# Altium footprint library SMT.PcbLib: 379 footprints (part 11 of 24)
Each footprint in its own frame and in the unit in brackets; x right, y up, seen from the top. Pads: shape width x height; smd on the part's side, far side on the other; paste and mask are expansions set on the pad; w line width, h text height; cw(c..) or ccw(c..) is an arc to the next point about the centre after c.
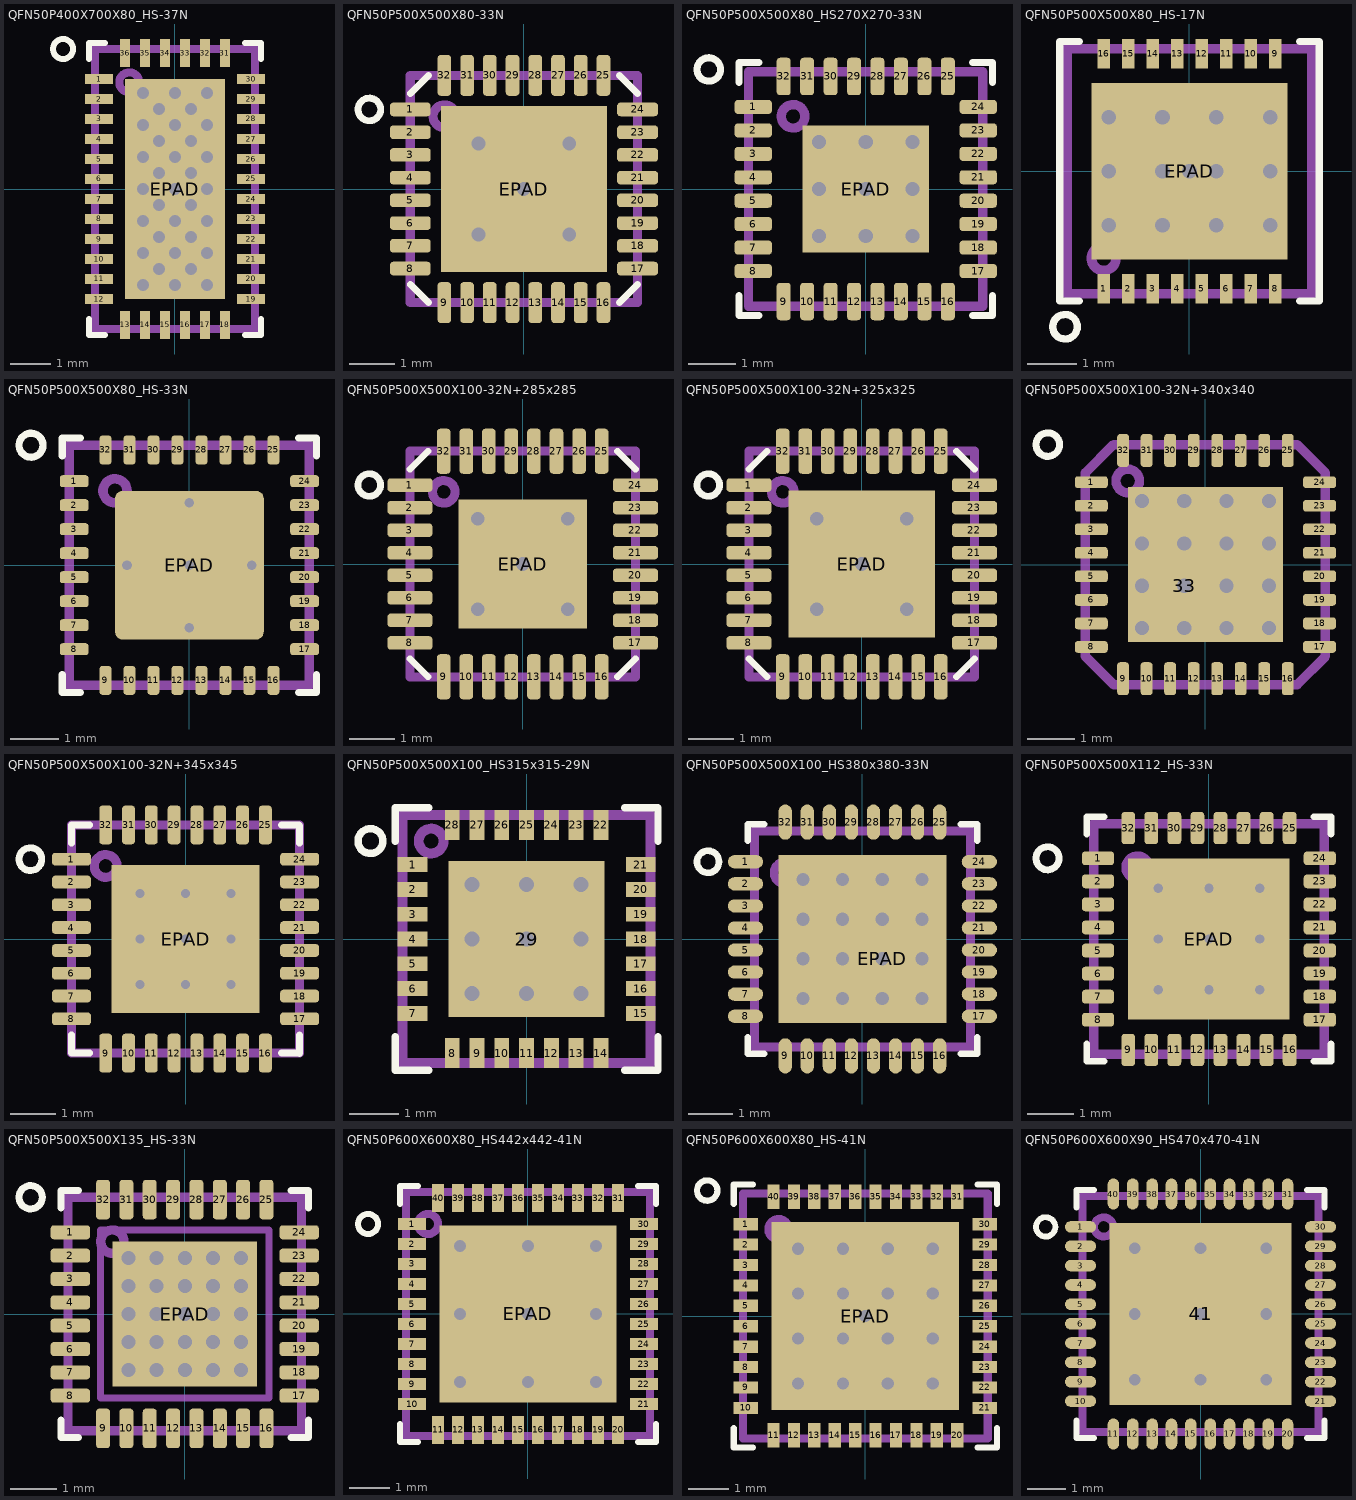
[diagram p10: the footprints below, top view; thin cyan lines are the x and y axes]

## QFN50P400X700X80_HS-37N [mm] "QFN, 36-Leads, Body 4,00x7,00mm, Pitch 0,50mm, Thermal Pad 2,50x5,50mm, IPC Medium Density"
height 0.8
pads (37):
  rect 0.7x0.25 smd paste+0 mask+0.05: 1(-1.9,2.75) 2(-1.9,2.25) 3(-1.9,1.75) 4(-1.9,1.25) 5(-1.9,0.75) 6(-1.9,0.25) 7(-1.9,-0.25) 8(-1.9,-0.75) 9(-1.9,-1.25) 10(-1.9,-1.75) 11(-1.9,-2.25) 12(-1.9,-2.75) 19(1.9,-2.75) 20(1.9,-2.25) 21(1.9,-1.75) 22(1.9,-1.25) 23(1.9,-0.75) 24(1.9,-0.25) 25(1.9,0.25) 26(1.9,0.75) 27(1.9,1.25) 28(1.9,1.75) 29(1.9,2.25) 30(1.9,2.75)
  rect 0.25x0.7 smd paste+0 mask+0.05: 13(-1.25,-3.4) 14(-0.75,-3.4) 15(-0.25,-3.4) 16(0.25,-3.4) 17(0.75,-3.4) 18(1.25,-3.4) 31(1.25,3.4) 32(0.75,3.4) 33(0.25,3.4) 34(-0.25,3.4) 35(-0.75,3.4) 36(-1.25,3.4)
  rect 2.5x5.5 hole 0.3 mask+0.05: EPAD(0,0)
via -0.4,0.4 diameter 0.6 hole 0.3
via 0.4,0.4 diameter 0.6 hole 0.3
via 0.8,0.8 diameter 0.6 hole 0.3
via 0,0.8 diameter 0.6 hole 0.3
via -0.8,0.8 diameter 0.6 hole 0.3
via -0.8,1.6 diameter 0.6 hole 0.3
via 0,1.6 diameter 0.6 hole 0.3
via 0.8,1.6 diameter 0.6 hole 0.3
via 0.4,1.2 diameter 0.6 hole 0.3
via -0.4,1.2 diameter 0.6 hole 0.3
via 0,2.4 diameter 0.6 hole 0.3
via 0.8,2.4 diameter 0.6 hole 0.3
via 0.4,2 diameter 0.6 hole 0.3
via -0.4,2 diameter 0.6 hole 0.3
via 0.8,0 diameter 0.6 hole 0.3
via -0.8,0 diameter 0.6 hole 0.3
via -0.8,2.4 diameter 0.6 hole 0.3
via -0.8,-2.4 diameter 0.6 hole 0.3
via -0.4,-2 diameter 0.6 hole 0.3
via 0.4,-2 diameter 0.6 hole 0.3
via 0.8,-2.4 diameter 0.6 hole 0.3
via 0,-2.4 diameter 0.6 hole 0.3
via -0.4,-1.2 diameter 0.6 hole 0.3
via 0.4,-1.2 diameter 0.6 hole 0.3
via 0.8,-1.6 diameter 0.6 hole 0.3
via 0,-1.6 diameter 0.6 hole 0.3
via -0.8,-1.6 diameter 0.6 hole 0.3
via -0.8,-0.8 diameter 0.6 hole 0.3
via 0,-0.8 diameter 0.6 hole 0.3
via 0.8,-0.8 diameter 0.6 hole 0.3
via 0.4,-0.4 diameter 0.6 hole 0.3
via -0.4,-0.4 diameter 0.6 hole 0.3
Top Overlay:
  circle w0.15: c-2.8,3.5 r0.25
  lines w0.15: -2.15,-3.25 -2.15,-3.65 -1.75,-3.65 ; -2.15,3.25 -2.15,3.65 -1.75,3.65 ; 1.75,-3.65 2.15,-3.65 2.15,-3.25 ; 1.75,3.65 2.15,3.65 2.15,3.25
Top Paste:
  rectangle: -1.1,-2.4 -0.1,-0.2
  region: 1.1,-0.2 0.1,-0.2 0.1,-2.4 1.1,-2.4
  region: 1.1,2.4 0.1,2.4 0.1,0.2 1.1,0.2
  rectangle: -1.1,0.2 -0.1,2.4
Mechanical 1:
  circle w0.2: c-1.143,2.667 r0.25
  lines w0.2: -2,-3.5 -2,3.5 2,3.5 2,-3.5 -2,-3.5
3D body "QFN50P400X700X80_HS-37N.step": height 0.8, standoff 0, extent -2.001,-3.501 2.001,3.501

## QFN50P500X500X80-33N [mm] "QFN, 32-Leads, Body 5,00x5,00mm, Pitch 0,50mm, Thermal Pad 3,75x3,75mm, IPC Medium Density"
height 0.8
pads (33):
  rrect50% 0.9x0.3 smd mask+0.03: 1(-2.5,1.75) 2(-2.5,1.25) 3(-2.5,0.75) 4(-2.5,0.25) 5(-2.5,-0.25) 6(-2.5,-0.75) 7(-2.5,-1.25) 8(-2.5,-1.75) 17(2.5,-1.75) 18(2.5,-1.25) 19(2.5,-0.75) 20(2.5,-0.25) 21(2.5,0.25) 22(2.5,0.75) 23(2.5,1.25) 24(2.5,1.75)
  rrect50% 0.3x0.9 smd mask+0.03: 9(-1.75,-2.5) 10(-1.25,-2.5) 11(-0.75,-2.5) 12(-0.25,-2.5) 13(0.25,-2.5) 14(0.75,-2.5) 15(1.25,-2.5) 16(1.75,-2.5) 25(1.75,2.5) 26(1.25,2.5) 27(0.75,2.5) 28(0.25,2.5) 29(-0.25,2.5) 30(-0.75,2.5) 31(-1.25,2.5) 32(-1.75,2.5)
  rect 3.65x3.65 hole 0.3 mask+0.05: EPAD(0,0)
via -1,1 diameter 0.8 hole 0.3
via 1,1 diameter 0.8 hole 0.3
via -1,-1 diameter 0.8 hole 0.3
via 1,-1 diameter 0.8 hole 0.3
Top Overlay:
  circle w0.15: c-3.4,1.75 r0.25
  lines w0.15: -2.5,-2.1 -2.1,-2.5 ; -2.5,2.1 -2.1,2.5 ; 2.1,-2.5 2.5,-2.1 ; 2.1,2.5 2.5,2.1
Top Paste:
  region: 0.3,1.6 0.3,0.3 1.7,0.3 1.7,1.6
  region: 0.3,-0.4 0.3,-1.7 1.7,-1.7 1.7,-0.4
  region: -1.7,-0.4 -1.7,-1.7 -0.3,-1.7 -0.3,-0.4
  region: -1.7,1.6 -1.7,0.3 -0.3,0.3 -0.3,1.6
Mechanical 1:
  circle w0.2: c-1.75,1.6 r0.25
  lines w0.2: -2.5,-2.5 2.5,-2.5 2.5,2.5 -2.5,2.5 -2.5,-2.5
Mechanical 15:
  lines w0.2: -0.5,0 0.5,0 ; 0,-0.5 0,0.5
3D body "User Library-qfn32-5x5.STEP": height 0.8, standoff 0, extent -2.52,-2.51 2.5,2.51

## QFN50P500X500X80_HS270X270-33N [mm] "QFN, 32-Leads, Body 5,00x5,00mm, Pitch 0,50mm, Thermal Pad 2,70x2,70mm, IPC Medium Density"
height 0.8
pads (33):
  rrect50% 0.8x0.3 smd mask+0.05: 1(-2.4,1.75) 2(-2.4,1.25) 3(-2.4,0.75) 4(-2.4,0.25) 5(-2.4,-0.25) 6(-2.4,-0.75) 7(-2.4,-1.25) 8(-2.4,-1.75) 17(2.4,-1.75) 18(2.4,-1.25) 19(2.4,-0.75) 20(2.4,-0.25) 21(2.4,0.25) 22(2.4,0.75) 23(2.4,1.25) 24(2.4,1.75)
  rrect50% 0.3x0.8 smd mask+0.05: 9(-1.75,-2.4) 10(-1.25,-2.4) 11(-0.75,-2.4) 12(-0.25,-2.4) 13(0.25,-2.4) 14(0.75,-2.4) 15(1.25,-2.4) 16(1.75,-2.4) 25(1.75,2.4) 26(1.25,2.4) 27(0.75,2.4) 28(0.25,2.4) 29(-0.25,2.4) 30(-0.75,2.4) 31(-1.25,2.4) 32(-1.75,2.4)
  rect 2.7x2.7 hole 0.3 mask+0.05: EPAD(0,0)
via 0,1 diameter 0.6 hole 0.3
via 0,-1 diameter 0.6 hole 0.3
via 1,-1 diameter 0.6 hole 0.3
via 1,0 diameter 0.6 hole 0.3
via 1,1 diameter 0.6 hole 0.3
via -1,1 diameter 0.6 hole 0.3
via -1,0 diameter 0.6 hole 0.3
via -1,-1 diameter 0.6 hole 0.3
Top Overlay:
  circle w0.15: c-3.35,2.55 r0.25
  lines w0.15: -2.7,-2.275 -2.7,-2.7 -2.275,-2.7 ; -2.7,2.275 -2.7,2.7 -2.275,2.7 ; 2.275,-2.7 2.7,-2.7 2.7,-2.275 ; 2.275,2.7 2.7,2.7 2.7,2.275
Top Paste:
  rectangle: -1.2,-1.2 1.2,1.2
Mechanical 1:
  circle w0.2: c-1.55,1.55 r0.25
  lines w0.2: -2.5,-2.5 -2.5,2.5 2.5,2.5 2.5,-2.5 -2.5,-2.5
3D body "QFN50P500X500X80_HS-33N.step": height 0.8, standoff 0, extent -2.52,-2.52 2.52,2.52

## QFN50P500X500X80_HS-17N [mm] "QFN, 16-Leads, Body 5,00x5,00mm, Pitch 0,50mm, Thermal Pad 4,00x3,60mm, IPC Medium Density"
height 0.8
pads (17):
  rect 0.25x0.6 smd paste+0 mask+0.05: 1(-1.75,-2.4) 2(-1.25,-2.4) 3(-0.75,-2.4) 4(-0.25,-2.4) 5(0.25,-2.4) 6(0.75,-2.4) 7(1.25,-2.4) 8(1.75,-2.4) 9(1.75,2.4) 10(1.25,2.4) 11(0.75,2.4) 12(0.25,2.4) 13(-0.25,2.4) 14(-0.75,2.4) 15(-1.25,2.4) 16(-1.75,2.4)
  rect 4x3.6 hole 0.3 paste-10 mask+0.1: EPAD(0,0)
via 1.65,-1.1 diameter 0.7 hole 0.3
via 0.55,-1.1 diameter 0.7 hole 0.3
via -0.55,-1.1 diameter 0.7 hole 0.3
via -1.65,-1.1 diameter 0.7 hole 0.3
via 1.65,0 diameter 0.7 hole 0.3
via 0.55,0 diameter 0.7 hole 0.3
via -0.55,0 diameter 0.7 hole 0.3
via -1.65,0 diameter 0.7 hole 0.3
via 1.65,1.1 diameter 0.7 hole 0.3
via 0.55,1.1 diameter 0.7 hole 0.3
via -0.55,1.1 diameter 0.7 hole 0.3
via -1.65,1.1 diameter 0.7 hole 0.3
Top Overlay:
  circle w0.15: c-2.54,-3.175 r0.25
  lines w0.15: -2.25,-2.65 -2.65,-2.65 -2.65,2.65 -2.25,2.65 ; 2.25,-2.65 2.65,-2.65 2.65,2.65 2.25,2.65
Top Paste:
  rectangle: 0.2,0.2 1.597,1.597
  region: -0.2,1.597 -1.597,1.597 -1.597,0.2 -0.2,0.2
  region: -0.2,-0.2 -1.597,-0.2 -1.597,-1.597 -0.2,-1.597
  rectangle: 0.2,-1.597 1.597,-0.2
Mechanical 1:
  circle w0.2: c-1.75,-1.778 r0.25
  lines w0.2: -2.5,-2.5 2.5,-2.5 2.5,2.5 -2.5,2.5 -2.5,-2.5
3D body "NHQ0016A.stp": height 0.8, standoff -0.01, extent -2.5,-2.5 2.5,2.5

## QFN50P500X500X80_HS-33N [mm] "QFN, 32-Leads, Body 5,00x5,00mm, Pitch 0,50mm, Thermal Pad 3,1x3,1mm, IPC Medium Density"
height 0.8
pads (33):
  rrect50% 0.6x0.25 smd paste+0 mask+0.05: 1(-2.4,1.75) 2(-2.4,1.25) 3(-2.4,0.75) 4(-2.4,0.25) 5(-2.4,-0.25) 6(-2.4,-0.75) 7(-2.4,-1.25) 8(-2.4,-1.75) 17(2.4,-1.75) 18(2.4,-1.25) 19(2.4,-0.75) 20(2.4,-0.25) 21(2.4,0.25) 22(2.4,0.75) 23(2.4,1.25) 24(2.4,1.75)
  rrect50% 0.25x0.6 smd paste+0 mask+0.05: 9(-1.75,-2.4) 10(-1.25,-2.4) 11(-0.75,-2.4) 12(-0.25,-2.4) 13(0.25,-2.4) 14(0.75,-2.4) 15(1.25,-2.4) 16(1.75,-2.4) 25(1.75,2.4) 26(1.25,2.4) 27(0.75,2.4) 28(0.25,2.4) 29(-0.25,2.4) 30(-0.75,2.4) 31(-1.25,2.4) 32(-1.75,2.4)
  rrect10% 3.1x3.1 hole 0.2: EPAD(0,0)
via 0,1.3 diameter 0.5 hole 0.2
via 0,-1.3 diameter 0.5 hole 0.2
via 1.3,0 diameter 0.5 hole 0.2
via -1.3,0 diameter 0.5 hole 0.2
Top Overlay:
  circle w0.15: c-3.3,2.5 r0.25
  lines w0.15: -2.65,-2.275 -2.65,-2.65 -2.275,-2.65 ; -2.65,2.275 -2.65,2.65 -2.275,2.65 ; 2.275,-2.65 2.65,-2.65 2.65,-2.275 ; 2.275,2.65 2.65,2.65 2.65,2.275
Top Paste:
  region: 1.45,1.45 0.1,1.45 0.1,0.1 1.45,0.1
  region: -1.45,1.45 -1.45,0.1 -0.1,0.1 -0.1,1.45
  rectangle: -1.45,-1.45 -0.1,-0.1
  region: 1.45,-1.45 1.45,-0.1 0.1,-0.1 0.1,-1.45
Mechanical 1:
  circle w0.2: c-1.55,1.55 r0.25
  lines w0.2: -2.5,-2.5 -2.5,2.5 2.5,2.5 2.5,-2.5 -2.5,-2.5
3D body "QFN32-5X5.stp": height 0.79, standoff -0.01, extent -2.5,-2.5 2.5,2.5

## QFN50P500X500X100-32N+285x285 [mm] "QFN, 32-Leads, Body 5,0x5,0mm (max), Pitch 0,50mm, IPC Medium Density with thermal tab 2.85x2.85"
height 1
pads (33):
  rrect50% 1x0.3 smd mask+0.03: 1(-2.5,1.75) 2(-2.5,1.25) 3(-2.5,0.75) 4(-2.5,0.25) 5(-2.5,-0.25) 6(-2.5,-0.75) 7(-2.5,-1.25) 8(-2.5,-1.75) 17(2.5,-1.75) 18(2.5,-1.25) 19(2.5,-0.75) 20(2.5,-0.25) 21(2.5,0.25) 22(2.5,0.75) 23(2.5,1.25) 24(2.5,1.75)
  rrect50% 0.3x1 smd mask+0.03: 9(-1.75,-2.5) 10(-1.25,-2.5) 11(-0.75,-2.5) 12(-0.25,-2.5) 13(0.25,-2.5) 14(0.75,-2.5) 15(1.25,-2.5) 16(1.75,-2.5) 25(1.75,2.5) 26(1.25,2.5) 27(0.75,2.5) 28(0.25,2.5) 29(-0.25,2.5) 30(-0.75,2.5) 31(-1.25,2.5) 32(-1.75,2.5)
  rect 2.85x2.85 hole 0.3: EPAD(0,0)
via -1,1 diameter 0.8 hole 0.3
via -1,-1 diameter 0.8 hole 0.3
via 1,-1 diameter 0.8 hole 0.3
via 1,1 diameter 0.8 hole 0.3
Top Overlay:
  circle w0.15: c-3.4,1.75 r0.25
  lines w0.15: -2.5,-2.1 -2.1,-2.5 ; -2.5,2.1 -2.1,2.5 ; 2.1,-2.5 2.5,-2.1 ; 2.1,2.5 2.5,2.1
Top Paste:
  region: -1.3,1.3 -1.3,-1.3 1.3,-1.3 1.3,1.3
Mechanical 1:
  circle w0.2: c-1.75,1.6 r0.25
  lines w0.2: -2.5,-2.5 2.5,-2.5 2.5,2.5 -2.5,2.5 -2.5,-2.5
Mechanical 15:
  lines w0.2: -0.5,0 0.5,0 ; 0,-0.5 0,0.5
3D body "User Library-qfn32-5x5.STEP": height 0.8, standoff 0, extent -2.52,-2.51 2.5,2.51

## QFN50P500X500X100-32N+325x325 [mm] "QFN, 32-Leads, Body 5,0x5,0mm (max), Pitch 0,50mm, IPC Medium Density with thermal tab 3.25x3.25"
height 1
pads (33):
  rrect50% 1x0.3 smd mask+0.03: 1(-2.5,1.75) 2(-2.5,1.25) 3(-2.5,0.75) 4(-2.5,0.25) 5(-2.5,-0.25) 6(-2.5,-0.75) 7(-2.5,-1.25) 8(-2.5,-1.75) 17(2.5,-1.75) 18(2.5,-1.25) 19(2.5,-0.75) 20(2.5,-0.25) 21(2.5,0.25) 22(2.5,0.75) 23(2.5,1.25) 24(2.5,1.75)
  rrect50% 0.3x1 smd mask+0.03: 9(-1.75,-2.5) 10(-1.25,-2.5) 11(-0.75,-2.5) 12(-0.25,-2.5) 13(0.25,-2.5) 14(0.75,-2.5) 15(1.25,-2.5) 16(1.75,-2.5) 25(1.75,2.5) 26(1.25,2.5) 27(0.75,2.5) 28(0.25,2.5) 29(-0.25,2.5) 30(-0.75,2.5) 31(-1.25,2.5) 32(-1.75,2.5)
  rect 3.25x3.25 hole 0.3: EPAD(0,0)
via -1,1 diameter 0.8 hole 0.3
via 1,1 diameter 0.8 hole 0.3
via -1,-1 diameter 0.8 hole 0.3
via 1,-1 diameter 0.8 hole 0.3
Top Overlay:
  circle w0.15: c-3.4,1.75 r0.25
  lines w0.15: -2.5,-2.1 -2.1,-2.5 ; -2.5,2.1 -2.1,2.5 ; 2.1,-2.5 2.5,-2.1 ; 2.1,2.5 2.5,2.1
Top Paste:
  region: 0.25,1.5 0.25,0.3 1.55,0.3 1.55,1.5
  region: 0.25,-0.3 0.25,-1.5 1.55,-1.5 1.55,-0.3
  region: -1.5,-0.3 -1.5,-1.5 -0.2,-1.5 -0.2,-0.3
  region: -1.5,1.5 -1.5,0.3 -0.2,0.3 -0.2,1.5
Mechanical 1:
  circle w0.2: c-1.75,1.6 r0.25
  lines w0.2: -2.5,-2.5 2.5,-2.5 2.5,2.5 -2.5,2.5 -2.5,-2.5
Mechanical 15:
  lines w0.2: -0.5,0 0.5,0 ; 0,-0.5 0,0.5
3D body "User Library-qfn32-5x5.STEP": height 0.8, standoff 0, extent -2.52,-2.51 2.5,2.51

## QFN50P500X500X100-32N+340x340 [mm] "QFN, 32-Leads, Body 5,00x5,00mm, Pitch 0,50mm, Thermal Pad 3,30x3,30mm, IPC Medium Density"
height 1
pads (33):
  rrect50% 0.7x0.25 smd mask+0.05: 1(-2.425,1.75) 2(-2.425,1.25) 3(-2.425,0.75) 4(-2.425,0.25) 5(-2.425,-0.25) 6(-2.425,-0.75) 7(-2.425,-1.25) 8(-2.425,-1.75) 17(2.425,-1.75) 18(2.425,-1.25) 19(2.425,-0.75) 20(2.425,-0.25) 21(2.425,0.25) 22(2.425,0.75) 23(2.425,1.25) 24(2.425,1.75)
  rrect50% 0.25x0.7 smd mask+0.05: 9(-1.75,-2.425) 10(-1.25,-2.425) 11(-0.75,-2.425) 12(-0.25,-2.425) 13(0.25,-2.425) 14(0.75,-2.425) 15(1.25,-2.425) 16(1.75,-2.425) 25(1.75,2.425) 26(1.25,2.425) 27(0.75,2.425) 28(0.25,2.425) 29(-0.25,2.425) 30(-0.75,2.425) 31(-1.25,2.425) 32(-1.75,2.425)
  rect 3.3x3.3 hole 0.3 copper offset 0.45,0.45 mask+0.05: 33(-0.45,-0.45)
via -1.35,-1.35 diameter 0.6 hole 0.3
via -0.45,-1.35 diameter 0.6 hole 0.3
via 0.45,-1.35 diameter 0.6 hole 0.3
via 1.35,-1.35 diameter 0.6 hole 0.3
via 1.35,-0.45 diameter 0.6 hole 0.3
via 0.45,-0.45 diameter 0.6 hole 0.3
via -1.35,-0.45 diameter 0.6 hole 0.3
via -1.35,0.45 diameter 0.6 hole 0.3
via -0.45,0.45 diameter 0.6 hole 0.3
via 1.35,0.45 diameter 0.6 hole 0.3
via 1.35,1.35 diameter 0.6 hole 0.3
via 0.45,1.35 diameter 0.6 hole 0.3
via -0.45,1.35 diameter 0.6 hole 0.3
via -1.35,1.35 diameter 0.6 hole 0.3
via 0.45,0.45 diameter 0.6 hole 0.3
Top Overlay:
  circle w0.15: c-3.35,2.55 r0.25
Top Paste:
  drawing of 9 lines, arcs and shapes, not listed
Mechanical 1:
  circle w0.2: c-1.651,1.778 r0.25
  lines w0.2: -2.55,-1.95 -2.55,1.95 -1.95,2.55 1.95,2.55 2.55,1.95 2.55,-1.95 1.95,-2.55 -1.95,-2.55 -2.55,-1.95
3D body: height 1, standoff 0, extent -2.55,-2.55 2.55,2.55

## QFN50P500X500X100-32N+345x345 [mm] "QFN, 32-Leads, Body 5,0x5,0mm (max), Pitch 0,50mm, IPC Medium Density with thermal tab 3.45x3.45"
height 1
pads (33):
  rrect50% 0.85x0.28 smd paste-0.025 mask+0.03: 1(-2.5,1.75) 2(-2.5,1.25) 3(-2.5,0.75) 4(-2.5,0.25) 5(-2.5,-0.25) 6(-2.5,-0.75) 7(-2.5,-1.25) 8(-2.5,-1.75) 17(2.5,-1.75) 18(2.5,-1.25) 19(2.5,-0.75) 20(2.5,-0.25) 21(2.5,0.25) 22(2.5,0.75) 23(2.5,1.25) 24(2.5,1.75)
  rrect50% 0.28x0.85 smd paste-0.025 mask+0.03: 9(-1.75,-2.5) 10(-1.25,-2.5) 11(-0.75,-2.5) 12(-0.25,-2.5) 13(0.25,-2.5) 14(0.75,-2.5) 15(1.25,-2.5) 16(1.75,-2.5) 25(1.75,2.5) 26(1.25,2.5) 27(0.75,2.5) 28(0.25,2.5) 29(-0.25,2.5) 30(-0.75,2.5) 31(-1.25,2.5) 32(-1.75,2.5)
  rect 3.25x3.25 hole 0.2: EPAD(0,0)
via 0,-1 diameter 0.6 hole 0.2
via 1,-1 diameter 0.6 hole 0.2
via -1,-1 diameter 0.6 hole 0.2
via -1,1 diameter 0.6 hole 0.2
via 1,1 diameter 0.6 hole 0.2
via 0,1 diameter 0.6 hole 0.2
via -1,0 diameter 0.6 hole 0.2
via 1,0 diameter 0.6 hole 0.2
Top Overlay:
  circle w0.15: c-3.4,1.75 r0.25
  lines w0.15: -2.5,-2.1 -2.5,-2.5 -2.1,-2.5 ; -2.5,2.1 -2.5,2.5 -2.1,2.5 ; 2.1,-2.5 2.5,-2.5 ; 2.1,2.5 2.49,2.5 2.5,2.49 2.5,2.1 ; 2.5,-2.51 2.5,-2.1
Top Paste:
  region: 0.15,-0.15 0.15,-1.6 1.6,-1.6 1.6,-0.15
  region: -0.15,-0.15 -1.6,-0.15 -1.6,-1.6 -0.15,-1.6
  region: -0.15,0.15 -0.15,1.6 -1.6,1.6 -1.6,0.15
  rectangle: 0.15,0.15 1.6,1.6
Mechanical 1:
  circle w0.2: c-1.75,1.6 r0.25
  lines w0.2: -2.5,-2.5 -2.5,2.5 2.5,2.5 2.5,-2.5 -2.5,-2.5
Mechanical 15:
  lines w0.2: -0.5,0 0.5,0 ; 0,-0.5 0,0.5
3D body "User Library-qfn32-5x5.STEP": height 0.8, standoff 0, extent -2.52,-2.51 2.5,2.51

## QFN50P500X500X100_HS315x315-29N [mm] "QFN, 28-Leads, Body 5,00x5,00mm, Pitch 0,50mm, Thermal Pad 3,13x3,13mm, IPC Medium Density"
height 1
pads (29):
  rect 0.6x0.3 smd mask+0.03: 1(-2.3,1.5) 2(-2.3,1) 3(-2.3,0.5) 4(-2.3,0) 5(-2.3,-0.5) 6(-2.3,-1) 7(-2.3,-1.5) 15(2.3,-1.5) 16(2.3,-1) 17(2.3,-0.5) 18(2.3,0) 19(2.3,0.5) 20(2.3,1) 21(2.3,1.5)
  rect 0.3x0.6 smd mask+0.03: 8(-1.5,-2.3) 9(-1,-2.3) 10(-0.5,-2.3) 11(0,-2.3) 12(0.5,-2.3) 13(1,-2.3) 14(1.5,-2.3) 22(1.5,2.3) 23(1,2.3) 24(0.5,2.3) 25(0,2.3) 26(-0.5,2.3) 27(-1,2.3) 28(-1.5,2.3)
  rect 3.15x3.15 hole 0.3 mask-5: 29(0,0)
via 1.1,-1.1 diameter 0.7 hole 0.3
via 0,-1.1 diameter 0.7 hole 0.3
via -1.1,-1.1 diameter 0.7 hole 0.3
via 1.1,0 diameter 0.7 hole 0.3
via -1.1,0 diameter 0.7 hole 0.3
via 1.1,1.1 diameter 0.7 hole 0.3
via 0,1.1 diameter 0.7 hole 0.3
via -1.1,1.1 diameter 0.7 hole 0.3
Top Overlay:
  circle w0.15: c-3.15,1.975 r0.25
  lines w0.15: -2.65,-1.975 -2.65,-2.65 -1.975,-2.65 ; -2.65,1.975 -2.65,2.65 -1.975,2.65 ; 1.975,-2.65 2.65,-2.65 2.65,-1.975 ; 1.975,2.65 2.65,2.65 2.65,1.975
Top Paste:
  region: 1.3,0.4 0.7,0.4 0.7,0.1 1.3,0.1
  region: 1.3,-0.1 0.7,-0.1 0.7,-0.4 1.3,-0.4
  region: 1.3,-0.6 0.7,-0.6 0.7,-0.9 1.3,-0.9
  region: 1.3,-1.1 0.7,-1.1 0.7,-1.4 1.3,-1.4
  rectangle: 0.7,0.6 1.3,0.9
  rectangle: 0.7,1.1 1.3,1.4
  rectangle: -0.3,0.1 0.3,0.4
  rectangle: -0.3,-0.4 0.3,-0.1
  rectangle: -0.3,-0.9 0.3,-0.6
  rectangle: -0.3,-1.4 0.3,-1.1
  region: 0.3,0.9 -0.3,0.9 -0.3,0.6 0.3,0.6
  region: 0.3,1.4 -0.3,1.4 -0.3,1.1 0.3,1.1
  region: -0.7,1.4 -1.3,1.4 -1.3,1.1 -0.7,1.1
  region: -0.7,0.9 -1.3,0.9 -1.3,0.6 -0.7,0.6
  rectangle: -1.3,-1.4 -0.7,-1.1
  rectangle: -1.3,-0.9 -0.7,-0.6
  rectangle: -1.3,-0.4 -0.7,-0.1
  rectangle: -1.3,0.1 -0.7,0.4
Top Solder:
  rectangle: -1.4,1.1 -0.6,1.4
  rectangle: -1.4,0.6 -0.6,0.9
  rectangle: -1.4,0.1 -0.6,0.4
  rectangle: -1.4,-0.4 -0.6,-0.1
  rectangle: -1.4,-0.9 -0.6,-0.6
  rectangle: -1.4,-1.4 -0.6,-1.1
  rectangle: -0.4,-1.4 0.4,-1.1
  rectangle: -0.4,-0.9 0.4,-0.6
  rectangle: -0.4,-0.4 0.4,-0.1
  rectangle: -0.4,0.1 0.4,0.4
  rectangle: -0.4,0.6 0.4,0.9
  rectangle: -0.4,1.1 0.4,1.4
  rectangle: 0.6,1.1 1.4,1.4
  rectangle: 0.6,0.6 1.4,0.9
  rectangle: 0.6,0.1 1.4,0.4
  rectangle: 0.6,-0.4 1.4,-0.1
  rectangle: 0.6,-0.9 1.4,-0.6
  rectangle: 0.6,-1.4 1.4,-1.1
Bottom Solder:
  rectangle: -1.6,-1.6 1.6,1.6
Mechanical 1:
  circle w0.2: c-1.925,1.975 r0.25
  lines w0.2: -2.5,-2.5 -2.5,2.5 2.5,2.5 2.5,-2.5 -2.5,-2.5
3D body "User Library-QFN28-0_5.STEP": height 1, standoff 0, extent -2.5,-2.5 2.5,2.5

## QFN50P500X500X100_HS380x380-33N [mm] "QFN, 32-Leads, Body 5,00x5,00mm, Pitch 0,50mm, Thermal Pad 3,80x3,80mm, IPC Medium Density"
height 1
pads (33):
  oval 0.8x0.3 smd mask+0.03: 1(-2.65,1.75) 2(-2.65,1.25) 3(-2.65,0.75) 4(-2.65,0.25) 5(-2.65,-0.25) 6(-2.65,-0.75) 7(-2.65,-1.25) 8(-2.65,-1.75) 17(2.65,-1.75) 18(2.65,-1.25) 19(2.65,-0.75) 20(2.65,-0.25) 21(2.65,0.25) 22(2.65,0.75) 23(2.65,1.25) 24(2.65,1.75)
  oval 0.3x0.8 smd mask+0.03: 9(-1.75,-2.65) 10(-1.25,-2.65) 11(-0.75,-2.65) 12(-0.25,-2.65) 13(0.25,-2.65) 14(0.75,-2.65) 15(1.25,-2.65) 16(1.75,-2.65) 25(1.75,2.65) 26(1.25,2.65) 27(0.75,2.65) 28(0.25,2.65) 29(-0.25,2.65) 30(-0.75,2.65) 31(-1.25,2.65) 32(-1.75,2.65)
  rect 3.8x3.8 hole 0.3 copper offset -0.45,0.45 mask+0: EPAD(0.45,-0.45)
via -0.45,-1.35 diameter 0.7 hole 0.3
via -1.35,-0.45 diameter 0.7 hole 0.3
via -0.45,-0.45 diameter 0.7 hole 0.3
via -1.35,0.45 diameter 0.7 hole 0.3
via -0.45,0.45 diameter 0.7 hole 0.3
via 0.45,-1.35 diameter 0.7 hole 0.3
via 1.35,-1.35 diameter 0.7 hole 0.3
via 1.35,0.45 diameter 0.7 hole 0.3
via 0.45,0.45 diameter 0.7 hole 0.3
via -1.35,1.35 diameter 0.7 hole 0.3
via 1.35,1.35 diameter 0.7 hole 0.3
via 0.45,1.35 diameter 0.7 hole 0.3
via -0.45,1.35 diameter 0.7 hole 0.3
via 1.35,-0.45 diameter 0.7 hole 0.3
via -1.35,-1.35 diameter 0.7 hole 0.3
Top Overlay:
  circle w0.15: c-3.5,1.75 r0.25
  lines w0.15: -2.6,-2.225 -2.6,-2.6 -2.225,-2.6 ; -2.6,2.225 -2.6,2.6 -2.225,2.6 ; 2.225,-2.6 2.6,-2.6 2.6,-2.225 ; 2.225,2.6 2.6,2.6 2.6,2.225
Top Paste:
  rectangle: -1.25,-1.25 1.25,1.25
Mechanical 1:
  circle w0.2: c-1.75,1.5 r0.25
  lines w0.2: -2.45,-2.45 2.45,-2.45 2.45,2.45 -2.45,2.45 -2.45,-2.45
3D body "QFN32-5X5.STEP": height 0.92, standoff 0.02, extent -2.5,-2.5 2.5,2.5

## QFN50P500X500X112_HS-33N [mm] "QFN, 32-Leads, Body 5,00x5,00mm, Pitch 0,50mm, Thermal Pad 3,50x3,50mm, IPC Medium Density"
height 1.12
pads (33):
  rrect50% 0.7x0.3 smd mask+0.03: 1(-2.405,1.75) 2(-2.405,1.25) 3(-2.405,0.75) 4(-2.405,0.25) 5(-2.405,-0.25) 6(-2.405,-0.75) 7(-2.405,-1.25) 8(-2.405,-1.75) 17(2.405,-1.75) 18(2.405,-1.25) 19(2.405,-0.75) 20(2.405,-0.25) 21(2.405,0.25) 22(2.405,0.75) 23(2.405,1.25) 24(2.405,1.75)
  rrect50% 0.3x0.7 smd mask+0.03: 9(-1.75,-2.405) 10(-1.25,-2.405) 11(-0.75,-2.405) 12(-0.25,-2.405) 13(0.25,-2.405) 14(0.75,-2.405) 15(1.25,-2.405) 16(1.75,-2.405) 25(1.75,2.405) 26(1.25,2.405) 27(0.75,2.405) 28(0.25,2.405) 29(-0.25,2.405) 30(-0.75,2.405) 31(-1.25,2.405) 32(-1.75,2.405)
  rect 3.5x3.5 hole 0.2 mask+0.05: EPAD(0,0)
via 1.1,-1.1 diameter 0.5 hole 0.2
via 0,-1.1 diameter 0.5 hole 0.2
via -1.1,-1.1 diameter 0.5 hole 0.2
via 1.1,0 diameter 0.5 hole 0.2
via -1.1,0 diameter 0.5 hole 0.2
via 1.1,1.1 diameter 0.5 hole 0.2
via 0,1.1 diameter 0.5 hole 0.2
via -1.1,1.1 diameter 0.5 hole 0.2
Top Overlay:
  circle w0.15: c-3.5,1.75 r0.25
  lines w0.15: -2.65,-2.275 -2.65,-2.65 -2.275,-2.65 ; -2.65,2.275 -2.65,2.65 -2.275,2.65 ; 2.275,-2.65 2.65,-2.65 2.65,-2.275 ; 2.275,2.65 2.65,2.65 2.65,2.275
Top Paste:
  region: -0.125,0.25 -0.125,1.5 -1.5,1.5 -1.5,0.25
  region: 1.5,0.25 1.5,1.5 0.125,1.5 0.125,0.25
  region: -1.5,-0.25 -1.5,-1.5 -0.125,-1.5 -0.125,-0.25
  region: 0.125,-0.25 0.125,-1.5 1.5,-1.5 1.5,-0.25
Mechanical 1:
  circle w0.2: c-1.55,1.55 r0.25
  lines w0.2: -2.5,-2.5 2.5,-2.5 2.5,2.5 -2.5,2.5 -2.5,-2.5
3D body "User Library-qfn32-5x5.STEP": height 0.8, standoff 0, extent -2.52,-2.51 2.5,2.51

## QFN50P500X500X135_HS-33N [mm] "QFN, 32-Leads, Body 5,00x5,00mm, Pitch 0,50mm, Thermal Pad 3,10x3,10mm, IPC Medium Density"
height 1.35
pads (33):
  rrect50% 0.85x0.3 smd paste+0 mask+0.04: 1(-2.45,1.75) 2(-2.45,1.25) 3(-2.45,0.75) 4(-2.45,0.25) 5(-2.45,-0.25) 6(-2.45,-0.75) 7(-2.45,-1.25) 8(-2.45,-1.75) 17(2.45,-1.75) 18(2.45,-1.25) 19(2.45,-0.75) 20(2.45,-0.25) 21(2.45,0.25) 22(2.45,0.75) 23(2.45,1.25) 24(2.45,1.75)
  rrect50% 0.3x0.85 smd paste+0 mask+0.04: 9(-1.75,-2.45) 10(-1.25,-2.45) 11(-0.75,-2.45) 12(-0.25,-2.45) 13(0.25,-2.45) 14(0.75,-2.45) 15(1.25,-2.45) 16(1.75,-2.45) 25(1.75,2.45) 26(1.25,2.45) 27(0.75,2.45) 28(0.25,2.45) 29(-0.25,2.45) 30(-0.75,2.45) 31(-1.25,2.45) 32(-1.75,2.45)
  rect 3.1x3.1 hole 0.3: EPAD(0,0)
via -0.6,1.2 diameter 0.7 hole 0.3
via -1.2,1.2 diameter 0.7 hole 0.3
via -0.6,0.6 diameter 0.7 hole 0.3
via -1.2,0.6 diameter 0.7 hole 0.3
via -0.6,0 diameter 0.7 hole 0.3
via -1.2,0 diameter 0.7 hole 0.3
via -0.6,-0.6 diameter 0.7 hole 0.3
via -1.2,-0.6 diameter 0.7 hole 0.3
via -0.6,-1.2 diameter 0.7 hole 0.3
via -1.2,-1.2 diameter 0.7 hole 0.3
via 0.6,1.2 diameter 0.7 hole 0.3
via 1.2,1.2 diameter 0.7 hole 0.3
via 0.6,0.6 diameter 0.7 hole 0.3
via 1.2,0.6 diameter 0.7 hole 0.3
via 0.6,0 diameter 0.7 hole 0.3
via 1.2,0 diameter 0.7 hole 0.3
via 0.6,-0.6 diameter 0.7 hole 0.3
via 1.2,-0.6 diameter 0.7 hole 0.3
via 0.6,-1.2 diameter 0.7 hole 0.3
via 1.2,-1.2 diameter 0.7 hole 0.3
via 0,-0.6 diameter 0.7 hole 0.3
via 0,-1.2 diameter 0.7 hole 0.3
via 0,1.2 diameter 0.7 hole 0.3
via 0,0.6 diameter 0.7 hole 0.3
Top Overlay:
  circle w0.15: c-3.3,2.5 r0.25
  lines w0.15: -2.65,-2.275 -2.65,-2.65 -2.275,-2.65 ; -2.65,2.275 -2.65,2.65 -2.275,2.65 ; 2.275,-2.65 2.65,-2.65 2.65,-2.275 ; 2.275,2.65 2.65,2.65 2.65,2.275
Top Paste:
  rectangle: -1.325,-1.275 -0.2,-0.2
  region: 1.325,-0.2 0.2,-0.2 0.2,-1.275 1.325,-1.275
  region: 1.325,1.275 0.2,1.275 0.2,0.2 1.325,0.2
  rectangle: -1.325,0.2 -0.2,1.275
Mechanical 1:
  circle w0.2: c-1.55,1.55 r0.25
  lines w0.2: -2.5,-2.5 -2.5,2.5 2.5,2.5 2.5,-2.5 -2.5,-2.5
Mechanical 5:
  lines w0.15: -1.8,-1.8 1.8,-1.8 1.8,1.8 -1.8,1.8 -1.8,-1.8
Mechanical 20:
  text "Рекомендуется заполнить /  отверстия (слой Mech5)" at -5.2,3.3 h1
3D body "QFN50P500X500X135_HS-33N.step": height 1.35, standoff 0, extent -2.535,-2.535 2.535,2.535

## QFN50P600X600X80_HS442x442-41N [mm] "QFN, 40-Leads, Body 6,00x6,00mm, Pitch 0,50mm, Thermal Pad 4,42x4,42mm, IPC Medium Density"
height 0.8
pads (41):
  rect 0.7x0.3 smd paste+0 mask+0.03: 1(-2.9,2.25) 2(-2.9,1.75) 3(-2.9,1.25) 4(-2.9,0.75) 5(-2.9,0.25) 6(-2.9,-0.25) 7(-2.9,-0.75) 8(-2.9,-1.25) 9(-2.9,-1.75) 10(-2.9,-2.25) 21(2.9,-2.25) 22(2.9,-1.75) 23(2.9,-1.25) 24(2.9,-0.75) 25(2.9,-0.25) 26(2.9,0.25) 27(2.9,0.75) 28(2.9,1.25) 29(2.9,1.75) 30(2.9,2.25)
  rect 0.3x0.7 smd paste+0 mask+0.03: 11(-2.25,-2.9) 12(-1.75,-2.9) 13(-1.25,-2.9) 14(-0.75,-2.9) 15(-0.25,-2.9) 16(0.25,-2.9) 17(0.75,-2.9) 18(1.25,-2.9) 19(1.75,-2.9) 20(2.25,-2.9) 31(2.25,2.9) 32(1.75,2.9) 33(1.25,2.9) 34(0.75,2.9) 35(0.25,2.9) 36(-0.25,2.9) 37(-0.75,2.9) 38(-1.25,2.9) 39(-1.75,2.9) 40(-2.25,2.9)
  rect 4.42x4.42 hole 0.3 paste+0 mask-5: EPAD(0,0)
via 1.7,1.7 diameter 0.7 hole 0.3
via -1.7,1.7 diameter 0.7 hole 0.3
via 1.7,0 diameter 0.7 hole 0.3
via -1.7,0 diameter 0.7 hole 0.3
via -1.7,-1.7 diameter 0.7 hole 0.3
via 1.7,-1.7 diameter 0.7 hole 0.3
via 0,-1.7 diameter 0.7 hole 0.3
via 0,1.7 diameter 0.7 hole 0.3
Top Overlay:
  circle w0.15: c-4,2.25 r0.25
  lines w0.15: -3.2,-2.75 -3.2,-3.2 -2.75,-3.2 ; -3.2,2.75 -3.2,3.2 -2.75,3.2 ; 2.75,-3.2 3.2,-3.2 3.2,-2.75 ; 2.75,3.2 3.2,3.2 3.2,2.75
Top Paste:
  rectangle: -2.159,1 -1,2.159
  region: 1,2.159 1,1 2.159,1 2.159,2.159
  region: -1,-2.159 -1,-1 -2.159,-1 -2.159,-2.159
  region: 2.159,-1 1,-1 1,-2.159 2.159,-2.159
  rectangle: -0.675,-0.675 0.675,0.675
  rectangle: -0.675,1 0.675,2.159
  region: 0.675,-1 -0.675,-1 -0.675,-2.159 0.675,-2.159
  region: 1,0.675 1,-0.675 2.159,-0.675 2.159,0.675
  region: -1,-0.675 -1,0.675 -2.159,0.675 -2.159,-0.675
Top Solder:
  rectangle: -0.75,-0.75 0.75,0.75
  rectangle: -0.75,0.925 0.75,2.159
  rectangle: 0.925,0.925 2.159,2.159
  rectangle: 0.925,-0.75 2.159,0.75
  rectangle: 0.925,-2.159 2.159,-0.925
  rectangle: -0.75,-2.159 0.75,-0.925
  rectangle: -2.159,-2.159 -0.925,-0.925
  rectangle: -2.159,-0.75 -0.925,0.75
  rectangle: -2.159,0.925 -0.925,2.159
Mechanical 1:
  circle w0.2: c-2.5,2.25 r0.25
  lines w0.2: -3.05,-3.05 3.05,-3.05 3.05,3.05 -3.05,3.05 -3.05,-3.05
3D body "QFN40-6X6.STEP": height 0.92, standoff 0.02, extent -3,-3 3,3

## QFN50P600X600X80_HS-41N [mm] "QFN, 40-Leads, Body 6,00x6,00mm, Pitch 0,50mm, Thermal Pad 4,60x4,60mm, IPC Medium Density"
height 0.8
pads (41):
  rect 0.6x0.3 smd mask+0.05: 1(-2.925,2.25) 2(-2.925,1.75) 3(-2.925,1.25) 4(-2.925,0.75) 5(-2.925,0.25) 6(-2.925,-0.25) 7(-2.925,-0.75) 8(-2.925,-1.25) 9(-2.925,-1.75) 10(-2.925,-2.25) 21(2.925,-2.25) 22(2.925,-1.75) 23(2.925,-1.25) 24(2.925,-0.75) 25(2.925,-0.25) 26(2.925,0.25) 27(2.925,0.75) 28(2.925,1.25) 29(2.925,1.75) 30(2.925,2.25)
  rect 0.3x0.6 smd mask+0.05: 11(-2.25,-2.925) 12(-1.75,-2.925) 13(-1.25,-2.925) 14(-0.75,-2.925) 15(-0.25,-2.925) 16(0.25,-2.925) 17(0.75,-2.925) 18(1.25,-2.925) 19(1.75,-2.925) 20(2.25,-2.925) 31(2.25,2.925) 32(1.75,2.925) 33(1.25,2.925) 34(0.75,2.925) 35(0.25,2.925) 36(-0.25,2.925) 37(-0.75,2.925) 38(-1.25,2.925) 39(-1.75,2.925) 40(-2.25,2.925)
  rect 4.6x4.6 hole 0.3: EPAD(0,0)
via -1.65,1.65 diameter 0.7 hole 0.3
via -0.55,1.65 diameter 0.7 hole 0.3
via 0.55,1.65 diameter 0.7 hole 0.3
via 1.65,1.65 diameter 0.7 hole 0.3
via -1.65,0.55 diameter 0.7 hole 0.3
via -0.55,0.55 diameter 0.7 hole 0.3
via 0.55,0.55 diameter 0.7 hole 0.3
via 1.65,0.55 diameter 0.7 hole 0.3
via -1.65,-0.55 diameter 0.7 hole 0.3
via -0.55,-0.55 diameter 0.7 hole 0.3
via 0.55,-0.55 diameter 0.7 hole 0.3
via 1.65,-0.55 diameter 0.7 hole 0.3
via -1.65,-1.65 diameter 0.7 hole 0.3
via -0.55,-1.65 diameter 0.7 hole 0.3
via 0.55,-1.65 diameter 0.7 hole 0.3
via 1.65,-1.65 diameter 0.7 hole 0.3
Top Overlay:
  circle w0.15: c-3.875,3.075 r0.25
  lines w0.15: -3.225,-2.75 -3.225,-3.225 -2.75,-3.225 ; -3.225,2.75 -3.225,3.225 -2.75,3.225 ; 2.75,-3.225 3.225,-3.225 3.225,-2.75 ; 2.75,3.225 3.225,3.225 3.225,2.75
Mechanical 1:
  circle w0.2: c-2.125,2.125 r0.25
  lines w0.2: -3,-3 3,-3 3,3 -3,3 -3,-3
3D body "QFN50P600X600X80_HS-41N.step": height 0.8, standoff 0, extent -3.076,-3.076 3.076,3.076

## QFN50P600X600X90_HS470x470-41N [mm] "QFN, 40-Leads, Body 6,00x6,00mm, Pitch 0,50mm, Thermal Pad 4,70x4,70mm, IPC Medium Density"
height 0.9
pads (41):
  oval 0.8x0.3 smd mask+0.03: 1(-3.1,2.25) 2(-3.1,1.75) 3(-3.1,1.25) 4(-3.1,0.75) 5(-3.1,0.25) 6(-3.1,-0.25) 7(-3.1,-0.75) 8(-3.1,-1.25) 9(-3.1,-1.75) 10(-3.1,-2.25) 21(3.1,-2.25) 22(3.1,-1.75) 23(3.1,-1.25) 24(3.1,-0.75) 25(3.1,-0.25) 26(3.1,0.25) 27(3.1,0.75) 28(3.1,1.25) 29(3.1,1.75) 30(3.1,2.25)
  oval 0.3x0.8 smd mask+0.03: 11(-2.25,-3.1) 12(-1.75,-3.1) 13(-1.25,-3.1) 14(-0.75,-3.1) 15(-0.25,-3.1) 16(0.25,-3.1) 17(0.75,-3.1) 18(1.25,-3.1) 19(1.75,-3.1) 20(2.25,-3.1) 31(2.25,3.1) 32(1.75,3.1) 33(1.25,3.1) 34(0.75,3.1) 35(0.25,3.1) 36(-0.25,3.1) 37(-0.75,3.1) 38(-1.25,3.1) 39(-1.75,3.1) 40(-2.25,3.1)
  rect 4.7x4.7 hole 0.3 mask-5: 41(0,0)
via 0,1.7 diameter 0.7 hole 0.3
via 0,-1.7 diameter 0.7 hole 0.3
via 1.7,-1.7 diameter 0.7 hole 0.3
via -1.7,-1.7 diameter 0.7 hole 0.3
via -1.7,0 diameter 0.7 hole 0.3
via 1.7,0 diameter 0.7 hole 0.3
via -1.7,1.7 diameter 0.7 hole 0.3
via 1.7,1.7 diameter 0.7 hole 0.3
Top Overlay:
  circle w0.15: c-4,2.25 r0.25
  lines w0.15: -3.2,-2.75 -3.2,-3.2 -2.75,-3.2 ; -3.2,2.75 -3.2,3.2 -2.75,3.2 ; 2.75,-3.2 3.2,-3.2 3.2,-2.75 ; 2.75,3.2 3.2,3.2 3.2,2.75
Top Paste:
  region: -1,-0.675 -1,0.675 -2.35,0.675 -2.35,-0.675
  region: 1,0.675 1,-0.675 2.35,-0.675 2.35,0.675
  region: 0.675,-1 -0.675,-1 -0.675,-2.35 0.675,-2.35
  rectangle: -0.675,1 0.675,2.35
  rectangle: -0.675,-0.675 0.675,0.675
  region: 2.35,-1 1,-1 1,-2.35 2.35,-2.35
  region: -1,-2.35 -1,-1 -2.35,-1 -2.35,-2.35
  region: 1,2.35 1,1 2.35,1 2.35,2.35
  rectangle: -2.35,1 -1,2.35
Top Solder:
  rectangle: -2.425,0.925 -0.925,2.425
  rectangle: -2.425,-0.75 -0.925,0.75
  rectangle: -2.425,-2.425 -0.925,-0.925
  rectangle: -0.75,-2.425 0.75,-0.925
  rectangle: 0.925,-2.425 2.425,-0.925
  rectangle: 0.925,-0.75 2.425,0.75
  rectangle: 0.925,0.925 2.425,2.425
  rectangle: -0.75,0.925 0.75,2.425
  rectangle: -0.75,-0.75 0.75,0.75
Bottom Solder:
  rectangle: -2.425,-2.425 2.425,2.425
Mechanical 1:
  circle w0.2: c-2.5,2.25 r0.25
  lines w0.2: -3.05,-3.05 -3.05,3.05 3.05,3.05 3.05,-3.05 -3.05,-3.05
3D body "QFN40-6X6.STEP": height 0.92, standoff 0.02, extent -3,-3 3,3